# Altium schematic symbol library TI - ADC.SchLib: 2197 symbols (part 81 of 130)
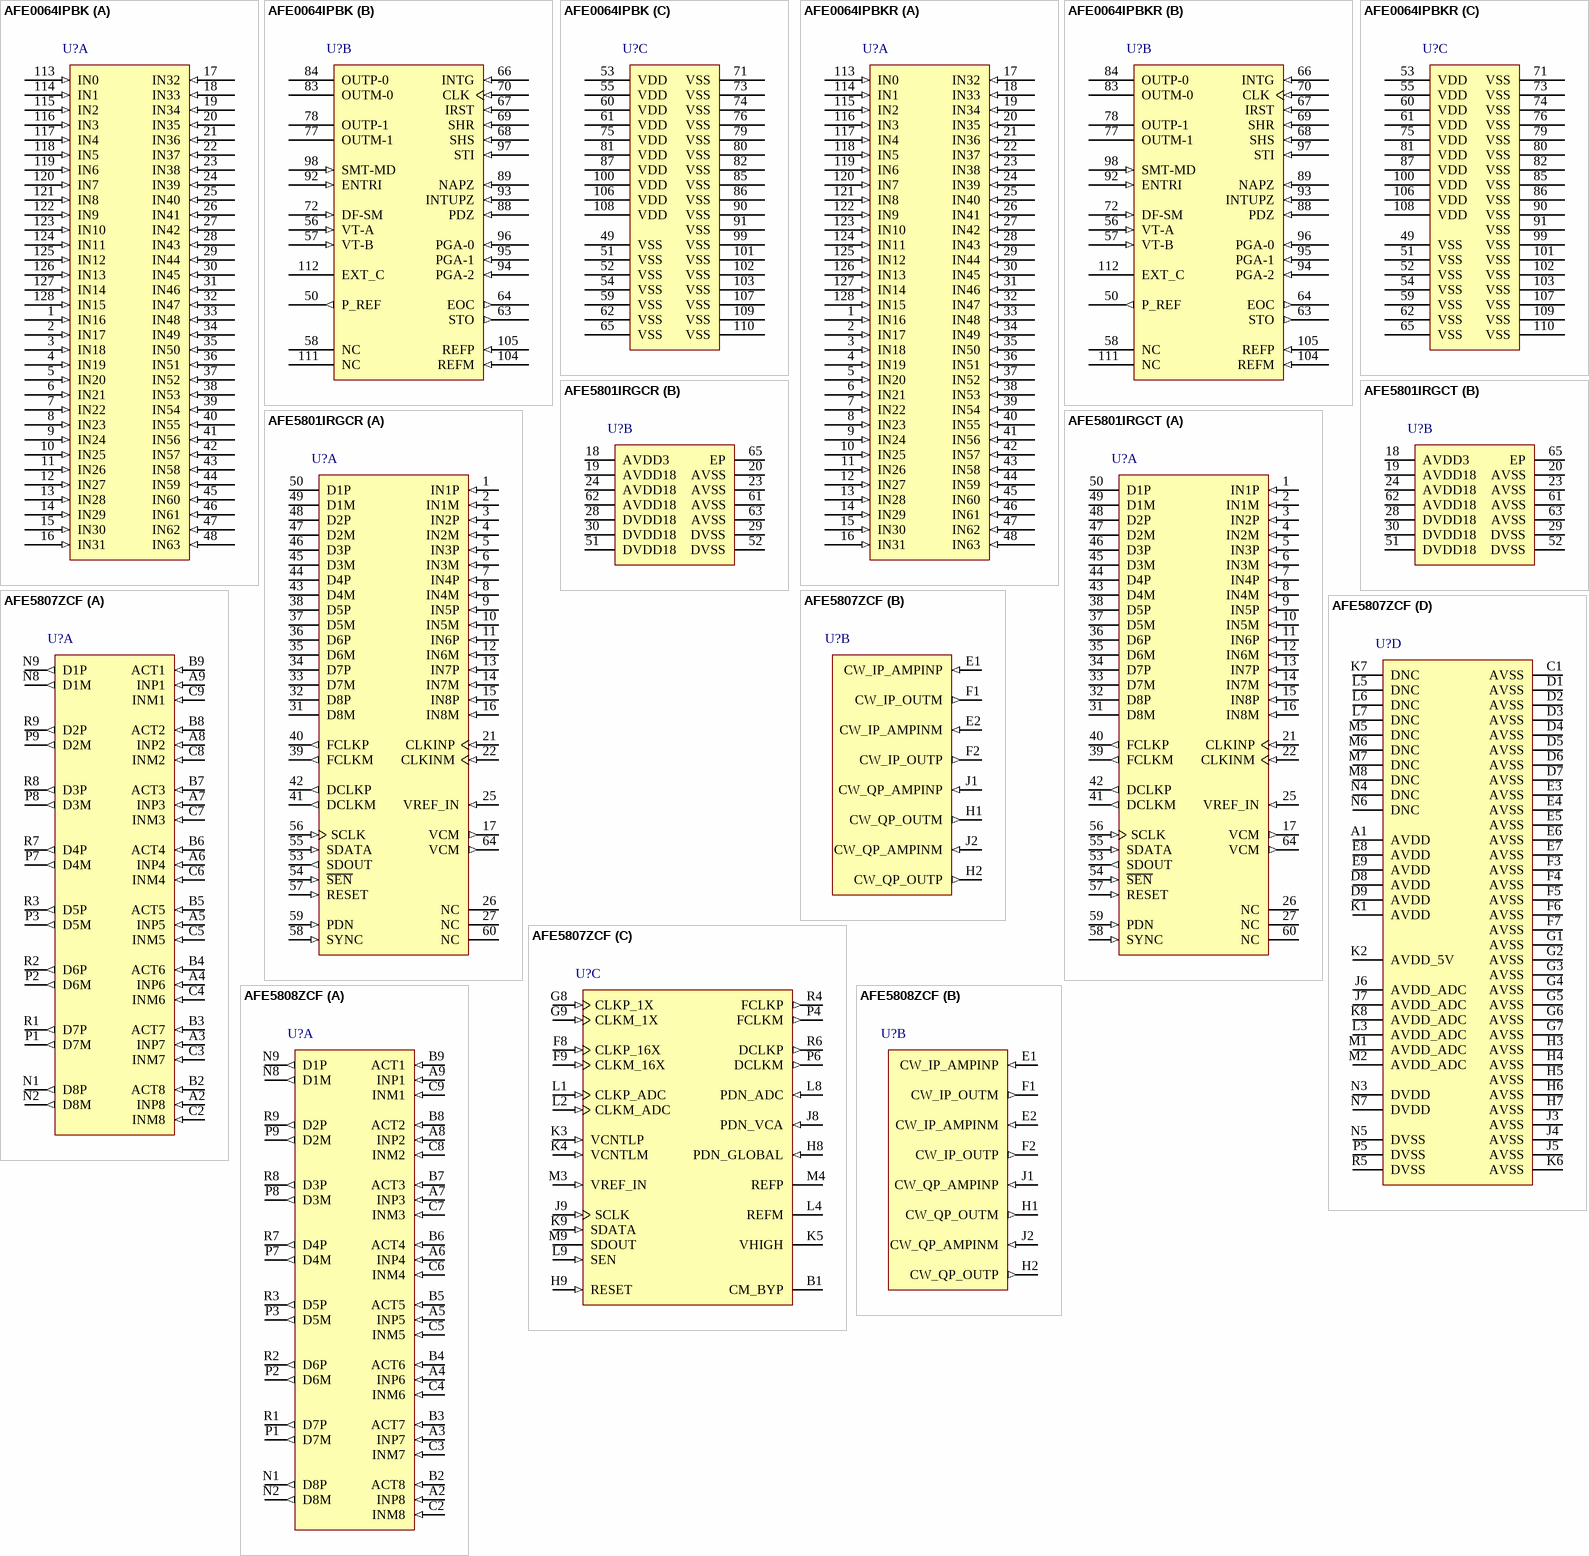
[diagram p206: symbols AFE0064IPBK to AFE5808ZCF]

## AFE5807ZCF
designator U?
8-Channel Analog Front End with Passive CW Mixer for Ultrasound, 0 to 85 degC, 135-pin BGA (ZCF135), Green (RoHS & no Sb/Br); Manufacturer: Texas Instruments; PartNumber: AFE5807ZCF; # Input Channels: 8; Analog Voltage AV/DD(Max)(V): 3.6; Analog Voltage AV/DD(Min)(V): 3.15; Digital Supply(Max)(V): 1.9; Digital Supply(Min)(V): 1.7; Resolution(Bits): 12; Sample Rate (max)(SPS): 80M; SNR(dB): 66.3; SubFamily: High Speed ADC (>10MSPS); DatasheetVersion: SLOS703C; PackageVersion: 4209006/A, 09/2007; PackageReference: ZCF135; PackageDescription: 135-Pin Plastic Grid Array, Body 15 x 9 mm, Pitch 1 mm; Supplier 1: Digi-Key; Supplier Part Number 1: ADS1210U-ND; Supplier 2: Mouser; Supplier Part Number 2: 595-ADS1210U; Eco-Plan: Green (RoHS & no Sb/Br); Mounting Technology: Surface Mount; ComponentLink1Description: Manufacturer URL; ComponentLink1URL: http://www.ti.com/; ComponentLink2Description: Datasheet; ComponentLink2URL: http://www.ti.com/general/docs/lit/getliterature.tsp?genericPartNumber=AFE5807&fileType=pdf; ComponentLink3Description: Package Specification; ComponentLink3URL: http://www.ti.com/litv/pdf/mpbg840
footprint TI-ZCF135 (BGA, 135-Balls, Body 15x9mm, Pitch 1mm)
part A pins: A2 INP8 (in) "CH1~8 analog inputs. AC couple to inputs with >= 0.1uF capacitors.", A3 INP7 (in) "CH1~8 analog inputs. AC couple to inputs with >= 0.1uF capacitors.", A4 INP6 (in) "CH1~8 analog inputs. AC couple to inputs with >= 0.1uF capacitors.", A5 INP5 (in) "CH1~8 analog inputs. AC couple to inputs with >= 0.1uF capacitors.", A6 INP4 (in) "CH1~8 analog inputs. AC couple to inputs with >= 0.1uF capacitors.", A7 INP3 (in) "CH1~8 analog inputs. AC couple to inputs with >= 0.1uF capacitors.", A8 INP2 (in) "CH1~8 analog inputs. AC couple to inputs with >= 0.1uF capacitors.", A9 INP1 (in) "CH1~8 analog inputs. AC couple to inputs with >= 0.1uF capacitors.", B2 ACT8 (in) "Active termination input pins for CH1~8. 1 uF capacitors are recommended.", B3 ACT7 (in) "Active termination input pins for CH1~8. 1 uF capacitors are recommended.", B4 ACT6 (in) "Active termination input pins for CH1~8. 1 uF capacitors are recommended.", B5 ACT5 (in) "Active termination input pins for CH1~8. 1 uF capacitors are recommended.", B6 ACT4 (in) "Active termination input pins for CH1~8. 1 uF capacitors are recommended.", B7 ACT3 (in) "Active termination input pins for CH1~8. 1 uF capacitors are recommended.", B8 ACT2 (in) "Active termination input pins for CH1~8. 1 uF capacitors are recommended.", B9 ACT1 (in) "Active termination input pins for CH1~8. 1 uF capacitors are recommended.", C2 INM8 (in) "CH1~8 complimentary analog inputs. Bypass to ground with >= 0.015uF capacitors. The HPF response of the LNA depends on the capacitors.", C3 INM7 (in) "CH1~8 complimentary analog inputs. Bypass to ground with >= 0.015uF capacitors. The HPF response of the LNA depends on the capacitors.", C4 INM6 (in) "CH1~8 complimentary analog inputs. Bypass to ground with >= 0.015uF capacitors. The HPF response of the LNA depends on the capacitors.", C5 INM5 (in) "CH1~8 complimentary analog inputs. Bypass to ground with >= 0.015uF capacitors. The HPF response of the LNA depends on the capacitors.", C6 INM4 (in) "CH1~8 complimentary analog inputs. Bypass to ground with >= 0.015uF capacitors. The HPF response of the LNA depends on the capacitors.", C7 INM3 (in) "CH1~8 complimentary analog inputs. Bypass to ground with >= 0.015uF capacitors. The HPF response of the LNA depends on the capacitors.", C8 INM2 (in) "CH1~8 complimentary analog inputs. Bypass to ground with >= 0.015uF capacitors. The HPF response of the LNA depends on the capacitors.", C9 INM1 (in) "CH1~8 complimentary analog inputs. Bypass to ground with >= 0.015uF capacitors. The HPF response of the LNA depends on the capacitors.", N1 D8P (out) "ADC CH1~8 LVDS positive outputs", N2 D8M (out) "ADC CH1~8 LVDS negative outputs", N8 D1M (out) "ADC CH1~8 LVDS negative outputs", N9 D1P (out) "ADC CH1~8 LVDS positive outputs", P1 D7M (out) "ADC CH1~8 LVDS negative outputs", P2 D6M (out) "ADC CH1~8 LVDS negative outputs", P3 D5M (out) "ADC CH1~8 LVDS negative outputs", P7 D4M (out) "ADC CH1~8 LVDS negative outputs", P8 D3M (out) "ADC CH1~8 LVDS negative outputs", P9 D2M (out) "ADC CH1~8 LVDS negative outputs", R1 D7P (out) "ADC CH1~8 LVDS positive outputs", R2 D6P (out) "ADC CH1~8 LVDS positive outputs", R3 D5P (out) "ADC CH1~8 LVDS positive outputs", R7 D4P (out) "ADC CH1~8 LVDS positive outputs", R8 D3P (out) "ADC CH1~8 LVDS positive outputs", R9 D2P (out) "ADC CH1~8 LVDS positive outputs"
part B pins: E1 CW_IP_AMPINP (in) "Positive differential input of the In-phase summing amplifier. External LPF capacitor has to be connected between CW_IP_AMPINP and CW_IP_OUTM. This pin becomes the CH7 PGA positive output when PGA test mode is enabled. Can (See Datasheet)", E2 CW_IP_AMPINM (in) "Negative differential input of the In-phase summing amplifier. External LPF capacitor has to be connected between CW_IP_AMPINM and CW_IP_OUTP. This pin becomes the CH7 PGA negative output when PGA test mode is enabled. Can (See Datasheet)", F1 CW_IP_OUTM (out) "Negative differential output for the In-phase summing amplifier. External LPF capacitor has to be connected between CW_IP_AMPINP and CW_IP_OUTPM. Can be floated if not used.", F2 CW_IP_OUTP (out) "Positive differential output for the In-phase summing amplifier. External LPF capacitor has to be connected between CW_IP_AMPINM and CW_IP_OUTP. Can be floated if not used.", H1 CW_QP_OUTM (out) "Negative differential output for the quadrature-phase summing amplifier. External LPF capacitor has to be connected between CW_QP_AMPINP and CW_QP_OUTM. Can be floated if not used.", H2 CW_QP_OUTP (out) "Positive differential output for the quadrature-phase summing amplifier. External LPF capacitor has to be connected between CW_QP_AMPINM and CW_QP_OUTP. Can be floated if not used.", J1 CW_QP_AMPINP (in) "Positive differential input of the quadrature-phase summing amplifier. External LPF capacitor has to be connected between CW_QP_AMPINP and CW_QP_OUTM. This pin becomes CH8 PGA positive output when PGA test mode is enabled. (See Datasheet)", J2 CW_QP_AMPINM (in) "Negative differential input of the quadrature-phase summing amplifier. External LPF capacitor has to be connected between CW_QP_AMPINM and CW_QP_OUTP. This pin becomes CH8 PGA negative output when PGA test mode is enabled. (See Datasheet)"
part C pins: B1 CM_BYP "Bias voltage and bypass to ground. >= 1uF is recommended. To suppress ultra low frequency noise, 10uF can be used.", F8 CLKP_16X (in) "Positive input of differential CW 16X clock. In 4X and 8X clock modes, this pin becomes the 4X or 8X CLKP input. In the 1X CW clock mode, this pin becomes the quadrature-phase 1X CLKP for the CW mixer. Can be floated if CW (See Datasheet)", F9 CLKM_16X (in) "Negative input of differential CW 16X clock. Tie to GND when the CMOS clock mode is enabled. In the 4X and 8X CW clock modes, this pin becomes the 4X or 8X CLKM input. In the 1X CW clock mode, this pin becomes the (See Datasheet)", G8 CLKP_1X (in) "Positive input of differential CW 1X clock. In the 1X clock mode, this pin is the In-phase 1X CLKP for the CW mixer. Can be floated if CW mode is not used.", G9 CLKM_1X (in) "Negative input of differential CW 1X clock. Tie to GND when the CMOS clock mode is enabled (Refer to Figure 89 for details). In the 1X clock mode, this pin is the In-phase 1X CLKM for the CW mixer. Can be floated if CW mode (See Datasheet)", H8 PDN_GLOBAL (in) "Global (complete) power-down control pin for the entire chip with an internal pull down resistor of 20kohm. Active High, 3.3V logic level is recommended.", H9 RESET (in) "Hardware reset pin with an internal pull-down resistor of 20kohm. Active high, 3.3V logic level is recommended.", J8 PDN_VCA (in) "VCA partial (fast) power down control pin with an internal pull down resistor of 20kohm. Active High, 3.3V logic level is recommended.", J9 SCLK (in) "Serial interface clock input with an internal pull-down resistor of 20kohm, 3.3V logic level is recommended.", K3 VCNTLP (in) "Positive differential attenuation control pin. Common mode voltage is 0.75V", K4 VCNTLM (in) "Negative differential attenuation control pin. Common mode voltage is 0.75V", K5 VHIGH "Bias voltage; bypass to ground with >=1uF.", K9 SDATA (in) "Serial interface data input with an internal pull-down resistor of 20kohm, 3.3V logic level is recommended.", L1 CLKP_ADC (in) "Positive input of differential ADC clock. In the single-end clock mode, it can be tied to clock signal directly or through a 0.1uF capacitor.", L2 CLKM_ADC (in) "Negative input of differential ADC clock. In the single-end clock mode, it can be tied to GND directly or through a 0.1uF capacitor.", L4 REFM "0.5V reference output in the internal reference mode. Must leave floated in the internal reference mode. Adding test point on PCB is recommended for monitoring the reference output.", L8 PDN_ADC (in) "ADC partial (fast) power down control pin with an internal pull down resistor of 100kohm. Active High. Either 1.8V or 3.3V logic level can be used.", L9 SEN (in) "Serial interface enable with an internal pull up resistor of 20kohm. Active low, 3.3V logic level is recommended.", M3 VREF_IN (in) "ADC 1.4V reference input in the external reference mode; bypass to ground with 0.1uF.", M4 REFP "1.5V reference output in the internal reference mode. Must leave floated in the internal reference mode. Adding test point on PCB is recommended for monitoring the reference output.", M9 SDOUT (hiz) "Serial interface data readout. High impedance when readout is disabled, 1.8V logic.", P4 FCLKM (out) "LVDS frame clock (1X) negative output", P6 DCLKM (out) "LVDS bit clock (6x or 7x) negative output", R4 FCLKP (out) "LVDS frame clock (1X) positive output", R6 DCLKP (out) "LVDS bit clock (6x or 7x) positive output"
part D pins: A1 AVDD (power) "3.3V Analog supply for LNA, VCAT, PGA, LPF and CWD blocks.", C1 AVSS (power) "Analog ground.", D1 AVSS (power) "Analog ground.", D2 AVSS (power) "Analog ground.", D3 AVSS (power) "Analog ground.", D4 AVSS (power) "Analog ground.", D5 AVSS (power) "Analog ground.", D6 AVSS (power) "Analog ground.", D7 AVSS (power) "Analog ground.", D8 AVDD (power) "3.3V Analog supply for LNA, VCAT, PGA, LPF and CWD blocks.", D9 AVDD (power) "3.3V Analog supply for LNA, VCAT, PGA, LPF and CWD blocks.", E3 AVSS (power) "Analog ground.", E4 AVSS (power) "Analog ground.", E5 AVSS (power) "Analog ground.", E6 AVSS (power) "Analog ground.", E7 AVSS (power) "Analog ground.", E8 AVDD (power) "3.3V Analog supply for LNA, VCAT, PGA, LPF and CWD blocks.", E9 AVDD (power) "3.3V Analog supply for LNA, VCAT, PGA, LPF and CWD blocks.", F3 AVSS (power) "Analog ground.", F4 AVSS (power) "Analog ground.", F5 AVSS (power) "Analog ground.", F6 AVSS (power) "Analog ground.", F7 AVSS (power) "Analog ground.", G1 AVSS (power) "Analog ground.", G2 AVSS (power) "Analog ground.", G3 AVSS (power) "Analog ground.", G4 AVSS (power) "Analog ground.", G5 AVSS (power) "Analog ground.", G6 AVSS (power) "Analog ground.", G7 AVSS (power) "Analog ground.", H3 AVSS (power) "Analog ground.", H4 AVSS (power) "Analog ground.", H5 AVSS (power) "Analog ground.", H6 AVSS (power) "Analog ground.", H7 AVSS (power) "Analog ground.", J3 AVSS (power) "Analog ground.", J4 AVSS (power) "Analog ground.", J5 AVSS (power) "Analog ground.", J6 AVDD_ADC (power) "1.8V Analog power supply for ADC.", J7 AVDD_ADC (power) "1.8V Analog power supply for ADC.", K1 AVDD (power) "3.3V Analog supply for LNA, VCAT, PGA, LPF and CWD blocks.", K2 AVDD_5V (power) "5V Analog supply for LNA, VCAT, PGA, LPF and CWD blocks.", K6 AVSS (power) "Analog ground.", K7 DNC "Do not connect. Must leave floated", K8 AVDD_ADC (power) "1.8V Analog power supply for ADC.", L3 AVDD_ADC (power) "1.8V Analog power supply for ADC.", L5 DNC "Do not connect. Must leave floated", L6 DNC "Do not connect. Must leave floated", L7 DNC "Do not connect. Must leave floated", M1 AVDD_ADC (power) "1.8V Analog power supply for ADC.", M2 AVDD_ADC (power) "1.8V Analog power supply for ADC.", M5 DNC "Do not connect. Must leave floated", M6 DNC "Do not connect. Must leave floated", M7 DNC "Do not connect. Must leave floated", M8 DNC "Do not connect. Must leave floated", N3 DVDD (power) "ADC digital and I/O power supply, 1.8V", N4 DNC "Do not connect. Must leave floated", N5 DVSS (power) "ADC digital ground", N6 DNC "Do not connect. Must leave floated", N7 DVDD (power) "ADC digital and I/O power supply, 1.8V", P5 DVSS (power) "ADC digital ground", R5 DVSS (power) "ADC digital ground"

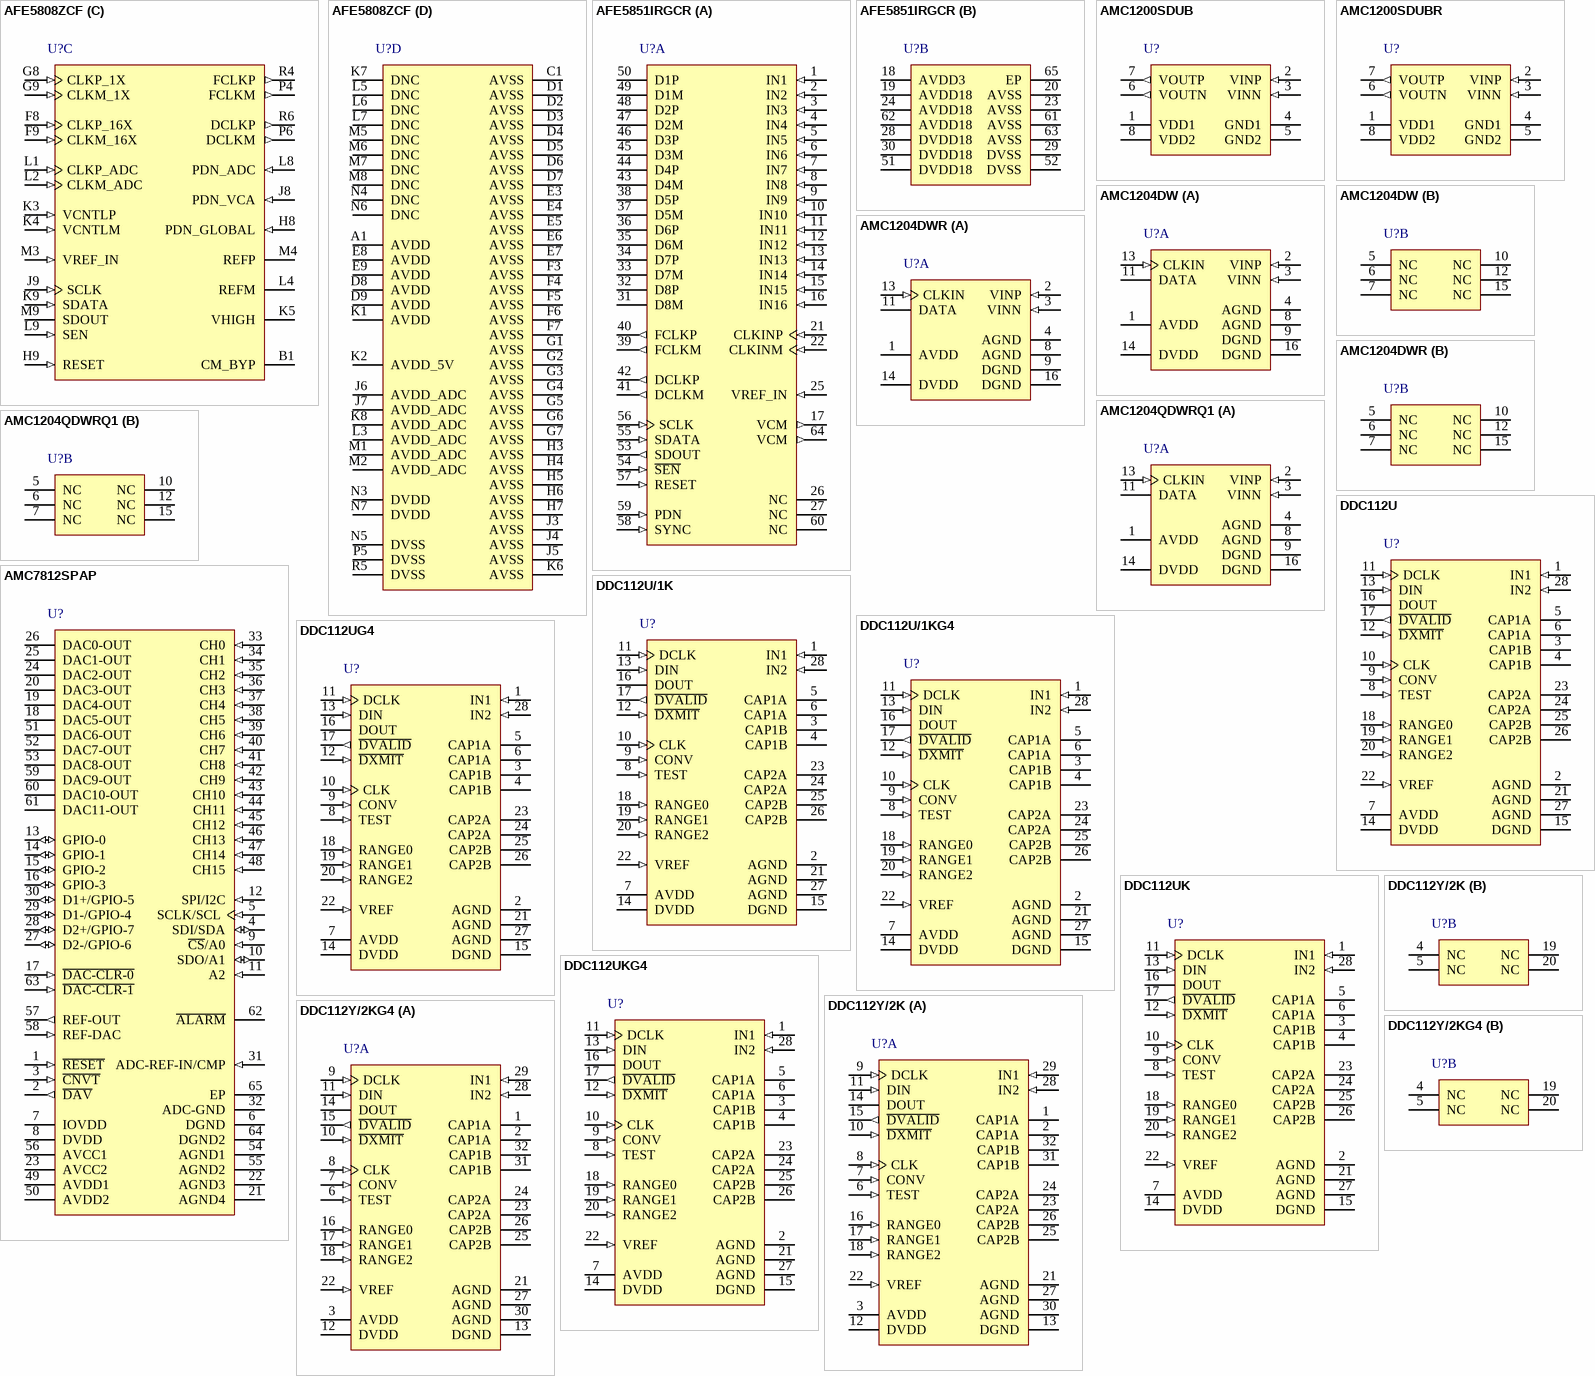
[diagram p89: symbols AFE5808ZCF to DDC112Y/2KG4]

## AFE5808ZCF
designator U?
8-Channel Analog Front End with Passive CW Mixer for Ultrasound, 0 to 70 degC, 135-pin BGA (ZCF135), Green (RoHS & no Sb/Br); Manufacturer: Texas Instruments; PartNumber: AFE5808ZCF; # Input Channels: 8; Analog Voltage AV/DD(Max)(V): 3.6; Analog Voltage AV/DD(Min)(V): 3.15; Digital Supply(Max)(V): 1.9; Digital Supply(Min)(V): 1.7; Resolution(Bits): 14; Sample Rate (max)(SPS): 65M; SNR(dB): 77; SubFamily: High Speed ADC (>10MSPS); DatasheetVersion: SLOS688C; PackageVersion: 4209006/A, 09/2007; PackageReference: ZCF135; PackageDescription: 135-Pin Plastic Grid Array, Body 15 x 9 mm, Pitch 1 mm; Supplier 1: Digi-Key; Supplier Part Number 1: 296-25892-2-ND; Supplier 2: Digi-Key; Supplier Part Number 2: 296-25892-1-ND; Supplier 3: Digi-Key; Supplier Part Number 3: 296-25892-6-ND; Supplier 4: Newark; Supplier Part Number 4: 74C6975; Supplier 5: Mouser; Supplier Part Number 5: 595-ADS1210U/1K; Eco-Plan: Green (RoHS & no Sb/Br); Mounting Technology: Surface Mount; ComponentLink1Description: Manufacturer URL; ComponentLink1URL: http://www.ti.com/; ComponentLink2Description: Datasheet; ComponentLink2URL: http://www.ti.com/general/docs/lit/getliterature.tsp?genericPartNumber=AFE5808&fileType=pdf; ComponentLink3Description: Package Specification; ComponentLink3URL: http://www.ti.com/litv/pdf/mpbg840
footprint TI-ZCF135 (BGA, 135-Balls, Body 15x9mm, Pitch 1mm)
part A pins: A2 INP8 (in) "CH1~8 analog inputs. AC couple to inputs with >= 0.1uF capacitors.", A3 INP7 (in) "CH1~8 analog inputs. AC couple to inputs with >= 0.1uF capacitors.", A4 INP6 (in) "CH1~8 analog inputs. AC couple to inputs with >= 0.1uF capacitors.", A5 INP5 (in) "CH1~8 analog inputs. AC couple to inputs with >= 0.1uF capacitors.", A6 INP4 (in) "CH1~8 analog inputs. AC couple to inputs with >= 0.1uF capacitors.", A7 INP3 (in) "CH1~8 analog inputs. AC couple to inputs with >= 0.1uF capacitors.", A8 INP2 (in) "CH1~8 analog inputs. AC couple to inputs with >= 0.1uF capacitors.", A9 INP1 (in) "CH1~8 analog inputs. AC couple to inputs with >= 0.1uF capacitors.", B2 ACT8 (in) "Active termination input pins for CH1~8. 1 uF capacitors are recommended.", B3 ACT7 (in) "Active termination input pins for CH1~8. 1 uF capacitors are recommended.", B4 ACT6 (in) "Active termination input pins for CH1~8. 1 uF capacitors are recommended.", B5 ACT5 (in) "Active termination input pins for CH1~8. 1 uF capacitors are recommended.", B6 ACT4 (in) "Active termination input pins for CH1~8. 1 uF capacitors are recommended.", B7 ACT3 (in) "Active termination input pins for CH1~8. 1 uF capacitors are recommended.", B8 ACT2 (in) "Active termination input pins for CH1~8. 1 uF capacitors are recommended.", B9 ACT1 (in) "Active termination input pins for CH1~8. 1 uF capacitors are recommended.", C2 INM8 (in) "CH1~8 complimentary analog inputs. Bypass to ground with >= 0.015uF capacitors. The HPF response of the LNA depends on the capacitors.", C3 INM7 (in) "CH1~8 complimentary analog inputs. Bypass to ground with >= 0.015uF capacitors. The HPF response of the LNA depends on the capacitors.", C4 INM6 (in) "CH1~8 complimentary analog inputs. Bypass to ground with >= 0.015uF capacitors. The HPF response of the LNA depends on the capacitors.", C5 INM5 (in) "CH1~8 complimentary analog inputs. Bypass to ground with >= 0.015uF capacitors. The HPF response of the LNA depends on the capacitors.", C6 INM4 (in) "CH1~8 complimentary analog inputs. Bypass to ground with >= 0.015uF capacitors. The HPF response of the LNA depends on the capacitors.", C7 INM3 (in) "CH1~8 complimentary analog inputs. Bypass to ground with >= 0.015uF capacitors. The HPF response of the LNA depends on the capacitors.", C8 INM2 (in) "CH1~8 complimentary analog inputs. Bypass to ground with >= 0.015uF capacitors. The HPF response of the LNA depends on the capacitors.", C9 INM1 (in) "CH1~8 complimentary analog inputs. Bypass to ground with >= 0.015uF capacitors. The HPF response of the LNA depends on the capacitors.", N1 D8P (out) "ADC CH1~8 LVDS positive outputs", N2 D8M (out) "ADC CH1~8 LVDS negative outputs", N8 D1M (out) "ADC CH1~8 LVDS negative outputs", N9 D1P (out) "ADC CH1~8 LVDS positive outputs", P1 D7M (out) "ADC CH1~8 LVDS negative outputs", P2 D6M (out) "ADC CH1~8 LVDS negative outputs", P3 D5M (out) "ADC CH1~8 LVDS negative outputs", P7 D4M (out) "ADC CH1~8 LVDS negative outputs", P8 D3M (out) "ADC CH1~8 LVDS negative outputs", P9 D2M (out) "ADC CH1~8 LVDS negative outputs", R1 D7P (out) "ADC CH1~8 LVDS positive outputs", R2 D6P (out) "ADC CH1~8 LVDS positive outputs", R3 D5P (out) "ADC CH1~8 LVDS positive outputs", R7 D4P (out) "ADC CH1~8 LVDS positive outputs", R8 D3P (out) "ADC CH1~8 LVDS positive outputs", R9 D2P (out) "ADC CH1~8 LVDS positive outputs"
part B pins: E1 CW_IP_AMPINP (in) "Positive differential input of the In-phase summing amplifier. External LPF capacitor has to be connected between CW_IP_AMPINP and CW_IP_OUTM. This pin becomes the CH7 PGA positive output when PGA test mode is enabled. Can (See Datasheet)", E2 CW_IP_AMPINM (in) "Negative differential input of the In-phase summing amplifier. External LPF capacitor has to be connected between CW_IP_AMPINM and CW_IP_OUTP. This pin becomes the CH7 PGA negative output when PGA test mode is enabled. Can (See Datasheet)", F1 CW_IP_OUTM (out) "Negative differential output for the In-phase summing amplifier. External LPF capacitor has to be connected between CW_IP_AMPINP and CW_IP_OUTPM. Can be floated if not used.", F2 CW_IP_OUTP (out) "Positive differential output for the In-phase summing amplifier. External LPF capacitor has to be connected between CW_IP_AMPINM and CW_IP_OUTP. Can be floated if not used.", H1 CW_QP_OUTM (out) "Negative differential output for the quadrature-phase summing amplifier. External LPF capacitor has to be connected between CW_QP_AMPINP and CW_QP_OUTM. Can be floated if not used.", H2 CW_QP_OUTP (out) "Positive differential output for the quadrature-phase summing amplifier. External LPF capacitor has to be connected between CW_QP_AMPINM and CW_QP_OUTP. Can be floated if not used.", J1 CW_QP_AMPINP (in) "Positive differential input of the quadrature-phase summing amplifier. External LPF capacitor has to be connected between CW_QP_AMPINP and CW_QP_OUTM. This pin becomes CH8 PGA positive output when PGA test mode is enabled. (See Datasheet)", J2 CW_QP_AMPINM (in) "Negative differential input of the quadrature-phase summing amplifier. External LPF capacitor has to be connected between CW_QP_AMPINM and CW_QP_OUTP. This pin becomes CH8 PGA negative output when PGA test mode is enabled. (See Datasheet)"
part C pins: B1 CM_BYP "Bias voltage and bypass to ground. >= 1uF is recommended. To suppress ultra low frequency noise, 10uF can be used.", F8 CLKP_16X (in) "Positive input of differential CW 16X clock. In 4X and 8X clock modes, this pin becomes the 4X or 8X CLKP input. In the 1X CW clock mode, this pin becomes the quadrature-phase 1X CLKP for the CW mixer. Can be floated if CW (See Datasheet)", F9 CLKM_16X (in) "Negative input of differential CW 16X clock. Tie to GND when the CMOS clock mode is enabled. In the 4X and 8X CW clock modes, this pin becomes the 4X or 8X CLKM input. In the 1X CW clock mode, this pin becomes the (See Datasheet)", G8 CLKP_1X (in) "Positive input of differential CW 1X clock. In the 1X clock mode, this pin is the In-phase 1X CLKP for the CW mixer. Can be floated if CW mode is not used.", G9 CLKM_1X (in) "Negative input of differential CW 1X clock. Tie to GND when the CMOS clock mode is enabled (Refer to Figure 89 for details). In the 1X clock mode, this pin is the In-phase 1X CLKM for the CW mixer. Can be floated if CW mode (See Datasheet)", H8 PDN_GLOBAL (in) "Global (complete) power-down control pin for the entire chip with an internal pull down resistor of 20kohm. Active High, 3.3V logic level is recommended.", H9 RESET (in) "Hardware reset pin with an internal pull-down resistor of 20kohm. Active high, 3.3V logic level is recommended.", J8 PDN_VCA (in) "VCA partial (fast) power down control pin with an internal pull down resistor of 20kohm. Active High, 3.3V logic level is recommended.", J9 SCLK (in) "Serial interface clock input with an internal pull-down resistor of 20kohm, 3.3V logic level is recommended.", K3 VCNTLP (in) "Positive differential attenuation control pin. Common mode voltage is 0.75V", K4 VCNTLM (in) "Negative differential attenuation control pin. Common mode voltage is 0.75V", K5 VHIGH "Bias voltage; bypass to ground with >=1uF.", K9 SDATA (in) "Serial interface data input with an internal pull-down resistor of 20kohm, 3.3V logic level is recommended.", L1 CLKP_ADC (in) "Positive input of differential ADC clock. In the single-end clock mode, it can be tied to clock signal directly or through a 0.1uF capacitor.", L2 CLKM_ADC (in) "Negative input of differential ADC clock. In the single-end clock mode, it can be tied to GND directly or through a 0.1uF capacitor.", L4 REFM "0.5V reference output in the internal reference mode. Must leave floated in the internal reference mode. Adding test point on PCB is recommended for monitoring the reference output.", L8 PDN_ADC (in) "ADC partial (fast) power down control pin with an internal pull down resistor of 100kohm. Active High. Either 1.8V or 3.3V logic level can be used.", L9 SEN (in) "Serial interface enable with an internal pull up resistor of 20kohm. Active low, 3.3V logic level is recommended.", M3 VREF_IN (in) "ADC 1.4V reference input in the external reference mode; bypass to ground with 0.1uF.", M4 REFP "1.5V reference output in the internal reference mode. Must leave floated in the internal reference mode. Adding test point on PCB is recommended for monitoring the reference output.", M9 SDOUT (hiz) "Serial interface data readout. High impedance when readout is disabled, 1.8V logic.", P4 FCLKM (out) "LVDS frame clock (1X) negative output", P6 DCLKM (out) "LVDS bit clock (6x or 7x) negative output", R4 FCLKP (out) "LVDS frame clock (1X) positive output", R6 DCLKP (out) "LVDS bit clock (6x or 7x) positive output"
part D pins: A1 AVDD (power) "3.3V Analog supply for LNA, VCAT, PGA, LPF and CWD blocks.", C1 AVSS (power) "Analog ground.", D1 AVSS (power) "Analog ground.", D2 AVSS (power) "Analog ground.", D3 AVSS (power) "Analog ground.", D4 AVSS (power) "Analog ground.", D5 AVSS (power) "Analog ground.", D6 AVSS (power) "Analog ground.", D7 AVSS (power) "Analog ground.", D8 AVDD (power) "3.3V Analog supply for LNA, VCAT, PGA, LPF and CWD blocks.", D9 AVDD (power) "3.3V Analog supply for LNA, VCAT, PGA, LPF and CWD blocks.", E3 AVSS (power) "Analog ground.", E4 AVSS (power) "Analog ground.", E5 AVSS (power) "Analog ground.", E6 AVSS (power) "Analog ground.", E7 AVSS (power) "Analog ground.", E8 AVDD (power) "3.3V Analog supply for LNA, VCAT, PGA, LPF and CWD blocks.", E9 AVDD (power) "3.3V Analog supply for LNA, VCAT, PGA, LPF and CWD blocks.", F3 AVSS (power) "Analog ground.", F4 AVSS (power) "Analog ground.", F5 AVSS (power) "Analog ground.", F6 AVSS (power) "Analog ground.", F7 AVSS (power) "Analog ground.", G1 AVSS (power) "Analog ground.", G2 AVSS (power) "Analog ground.", G3 AVSS (power) "Analog ground.", G4 AVSS (power) "Analog ground.", G5 AVSS (power) "Analog ground.", G6 AVSS (power) "Analog ground.", G7 AVSS (power) "Analog ground.", H3 AVSS (power) "Analog ground.", H4 AVSS (power) "Analog ground.", H5 AVSS (power) "Analog ground.", H6 AVSS (power) "Analog ground.", H7 AVSS (power) "Analog ground.", J3 AVSS (power) "Analog ground.", J4 AVSS (power) "Analog ground.", J5 AVSS (power) "Analog ground.", J6 AVDD_ADC (power) "1.8V Analog power supply for ADC.", J7 AVDD_ADC (power) "1.8V Analog power supply for ADC.", K1 AVDD (power) "3.3V Analog supply for LNA, VCAT, PGA, LPF and CWD blocks.", K2 AVDD_5V (power) "5V Analog supply for LNA, VCAT, PGA, LPF and CWD blocks.", K6 AVSS (power) "Analog ground.", K7 DNC "Do not connect. Must leave floated", K8 AVDD_ADC (power) "1.8V Analog power supply for ADC.", L3 AVDD_ADC (power) "1.8V Analog power supply for ADC.", L5 DNC "Do not connect. Must leave floated", L6 DNC "Do not connect. Must leave floated", L7 DNC "Do not connect. Must leave floated", M1 AVDD_ADC (power) "1.8V Analog power supply for ADC.", M2 AVDD_ADC (power) "1.8V Analog power supply for ADC.", M5 DNC "Do not connect. Must leave floated", M6 DNC "Do not connect. Must leave floated", M7 DNC "Do not connect. Must leave floated", M8 DNC "Do not connect. Must leave floated", N3 DVDD (power) "ADC digital and I/O power supply, 1.8V", N4 DNC "Do not connect. Must leave floated", N5 DVSS (power) "ADC digital ground", N6 DNC "Do not connect. Must leave floated", N7 DVDD (power) "ADC digital and I/O power supply, 1.8V", P5 DVSS (power) "ADC digital ground", R5 DVSS (power) "ADC digital ground"